# Altium schematic symbol library IC_ADI.SCHLIB: 3169 symbols (part 49 of 181)
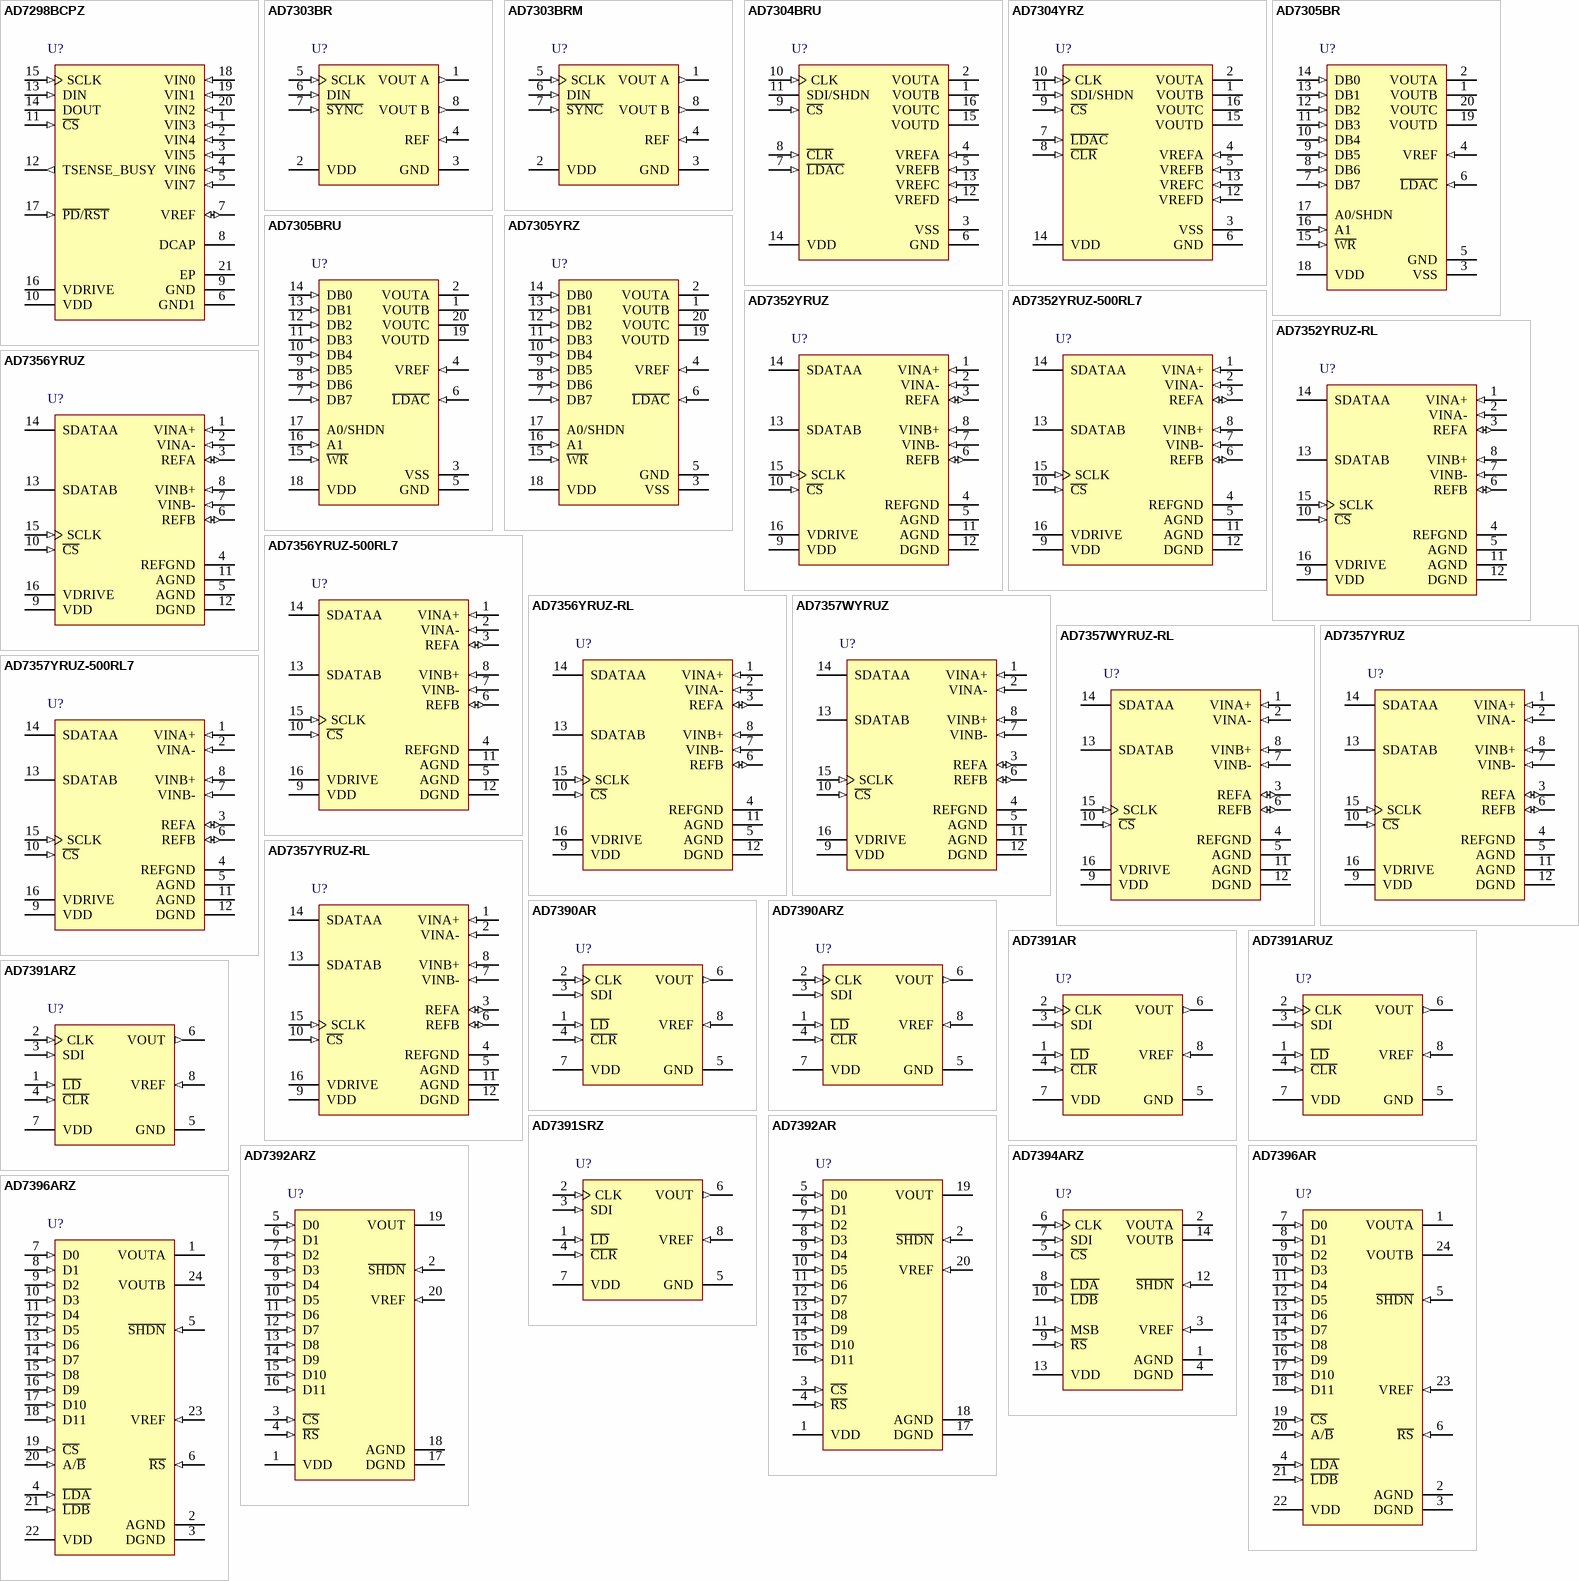
[diagram p239: symbols AD7298BCPZ to AD7396ARZ]

## AD7303BR
designator U?
Dual 8-Bit Voltage Output Digital-to-Analog Converter with Serial Interface, 2.7 to 5.5 V, 0 to +70 degC, R-8, Tube; Generic Part Number: AD7303; PartNumber: AD7303BR; # DAC Outputs: 2; Max V+: 5.5V; Op Pwr Diss: 6.93mW; Resolution (Bits): 8; Settling Time: 1.2祍; Single Supply: Yes; DatasheetVersion: Rev.0; PackageVersion: 060506-A; PackageReference: R-8; PackageDescription: 8-Lead Standard Small Outline Package [SOIC_N] Narrow Body; Supplier Part Number 1: AD7303BR-ND; Supplier Part Number 2: 584-AD7303BR; Packing: Tube; RoHS: N; Mounting Technology: Surface Mount; Code_JEDEC: MS-012-AA; Code_IPC: SOIC127P600-8; ComponentLink1Description: Manufacturer URL; ComponentLink2Description: Datasheet; ComponentLink3Description: Package Specification; ComponentLink4Description: Product URL
footprint SOIC8_1.27 (Footprint not found)
pins: 1 VOUT A (out) "Analog Output Voltage from DAC A. The output amplifier swings rail to rail on its output.", 2 VDD (power) "Power Supply Input. These parts can be operated from +2.7 V to +5.5 V and should be decoupled to GND.", 3 GND (power) "Ground reference point for all circuitry on the part.", 4 REF (in) "External Reference Input. This can be used as the reference for both DACs, and is selected by setting the I\N\T\/EXT bit in the control register to a logic one. The range on this reference input is 1 V to VDD/2. When the (See Datasheet)", 5 SCLK (in) "Serial Clock. Logic Input. Data is clocked into the input shift register on the rising edge of the serial clock input. Data can be transferred at rates up to 30 MHz.", 6 DIN (in) "Serial Data Input. This device has a 16-bit shift register, 8 bits for data and 8 bits for control. Data is clocked into the register on the rising edge of the clock input.", 7 ~{SYNC} (in) "Level Triggered Control Input (active low). This is the frame synchronization signal for the input data. When S\Y\N\C\ goes low, it enables the input shift register and data is transferred in on the rising edges of the (See Datasheet)", 8 VOUT B (out) "Analog output voltage from DAC B. The output amplifier swings rail to rail on its output."

## AD7303BRM
designator U?
Dual 8-Bit Voltage Output Digital-to-Analog Converter with Serial Interface, 2.7 to 5.5 V, -40 to +105 degC, RM-8, Tube; Generic Part Number: AD7303; PartNumber: AD7303BRM; # DAC Outputs: 2; Max V+: 5.5V; Op Pwr Diss: 6.93mW; Resolution (Bits): 8; Settling Time: 1.2祍; Single Supply: Yes; DatasheetVersion: Rev.0; PackageVersion: Aug-2005; PackageReference: RM-8; PackageDescription: 8-Lead Mini Small Outline Package [MSOP]; Supplier Part Number 1: AD7303BRM-ND; Supplier Part Number 2: 584-AD7303BRM; Packing: Tube; RoHS: N; Mounting Technology: Surface Mount; Code_JEDEC: MO-187-AA; ComponentLink1Description: Manufacturer URL; ComponentLink2Description: Datasheet; ComponentLink3Description: Package Specification; ComponentLink4Description: Product URL
footprint VSSOP8_0.65 (Footprint not found)
pins: 1 VOUT A (out) "Analog Output Voltage from DAC A. The output amplifier swings rail to rail on its output.", 2 VDD (power) "Power Supply Input. These parts can be operated from +2.7 V to +5.5 V and should be decoupled to GND.", 3 GND (power) "Ground reference point for all circuitry on the part.", 4 REF (in) "External Reference Input. This can be used as the reference for both DACs, and is selected by setting the I\N\T\/EXT bit in the control register to a logic one. The range on this reference input is 1 V to VDD/2. When the (See Datasheet)", 5 SCLK (in) "Serial Clock. Logic Input. Data is clocked into the input shift register on the rising edge of the serial clock input. Data can be transferred at rates up to 30 MHz.", 6 DIN (in) "Serial Data Input. This device has a 16-bit shift register, 8 bits for data and 8 bits for control. Data is clocked into the register on the rising edge of the clock input.", 7 ~{SYNC} (in) "Level Triggered Control Input (active low). This is the frame synchronization signal for the input data. When S\Y\N\C\ goes low, it enables the input shift register and data is transferred in on the rising edges of the (See Datasheet)", 8 VOUT B (out) "Analog output voltage from DAC B. The output amplifier swings rail to rail on its output."

## AD7304BRU
designator U?
Quad 8-Bit Rail-to-Rail Output Digital-to-Analog Converter, 3 V / 5 V, -40 to +85 degC, RU-16, Tube; Generic Part Number: AD7304; PartNumber: AD7304BRU; # DAC Outputs: 4; Max V+: 5.5V; Op Pwr Diss: 60mW; Resolution (Bits): 8; Settling Time: 1祍; Single Supply: Yes; DatasheetVersion: Rev.C; PackageVersion: Nov-2002; PackageReference: RU-16; PackageDescription: 16-Lead Thin Shrink Small Outline Package [TSSOP]; Supplier Part Number 1: AD7304BRU-ND; Supplier Part Number 2: 584-AD7304BRU; Packing: Tube; RoHS: N; Mounting Technology: Surface Mount; Code_JEDEC: MO-153-AB; ComponentLink1Description: Manufacturer URL; ComponentLink2Description: Datasheet; ComponentLink3Description: Package Specification; ComponentLink4Description: Product URL
footprint TSSOP16_0.65 (Footprint not found)
pins: 1 VOUTB (hiz) "Channel B Rail-to-Rail Buffered DAC Voltage Output. Full-scale set by reference voltage applied to VREFB pin. Output is open circuit when SHDN is enabled.", 2 VOUTA (hiz) "Channel A Rail-to-Rail Buffered DAC Voltage Output. Full-scale set by reference voltage applied to VREFA pin. Output is open circuit when SHDN is enabled.", 3 VSS (power) "Negative Power Supply Input. Specified range of operation is 0 V to -5.5 V.", 4 VREFA (in) "Channel A Reference Input. Establishes VOUTA full-scale voltage. Specified range of operation is VSS < VREFA < VDD.", 5 VREFB (in) "Channel B Reference Input. Establishes VOUTB full-scale voltage. Specified range of operation is VSS < VREFB < VDD.", 6 GND (power) "Common Analog and Digital Ground.", 7 ~{LDAC} (in) "Load DAC Register Strobe, Active Low. Simultaneously transfers data from all four input registers into the corresponding DAC registers. Asynchronous active low input. DAC register is transparent when L\D\A\C\ = 0. See Table (See Datasheet)", 8 ~{CLR} (in) "Clears All Input and DAC Registers to the Zero Condition. Asynchronous active low input. The serial register is not effected.", 9 ~{CS} (in) "Chip Select, Active Low Input. Disables shift register loading when high. Transfers serial input register data to the decoded input register when C\S\ returns high. Does not effect L\D\A\C\ operation.", 10 CLK (in) "Clock Input, Positive Edge Clocks Data into Shift Register. Disabled by chip select C\S\.", 11 SDI/SHDN "Serial Data Input Loads Directly into the Shift Register, MSB First. Hardware shutdown (SHDN) control input, active when pin is left floating by a three-state logic driver. Does not effect DAC register contents as long as (See Datasheet)", 12 VREFD (in) "Channel D Reference Input. Establishes VOUTD full-scale voltage. Specified range of operation is VSS < VREFD < VDD.", 13 VREFC (in) "Channel C Reference Input. Establishes VOUTC full-scale voltage. Specified range of operation is VSS VREFC < VDD.", 14 VDD (power) "Positive Power Supply Input. Specified range of operation is 2.7 V to 5.5 V.", 15 VOUTD (hiz) "Channel D Rail-to-Rail Buffered DAC Voltage Output. Full-scale set by reference voltage applied to VREFD pin. Output is open circuit when SHDN is enabled.", 16 VOUTC (hiz) "Channel C Rail-to-Rail Buffered DAC Voltage Output. Full-scale set by reference voltage applied to VREFC pin. Output is open circuit when SHDN is enabled."

## AD7304YRZ
designator U?
Quad 8-Bit Rail-to-Rail Output Digital-to-Analog Converter, 3 V / 5 V, -40 to +85 degC, RW-16, Pb-Free, Tube; Generic Part Number: AD7304; PartNumber: AD7304YRZ; # DAC Outputs: 4; Max V+: 5.5V; Op Pwr Diss: 60mW; Resolution (Bits): 8; Settling Time: 1祍; Single Supply: Yes; DatasheetVersion: Rev.C; PackageVersion: 032707-B; PackageReference: RW-16; PackageDescription: 16-Lead Standard Small Outline Package [SOIC_W]; Supplier Part Number 1: AD7304YRZ-ND; Supplier Part Number 2: 1438404; Supplier Part Number 3: 15P0787; Supplier Part Number 4: 584-AD7304YRZ; Packing: Tube; RoHS: Y; Mounting Technology: Surface Mount; Code_JEDEC: MS-013-AA; Code_IPC: SOIC127P1030-16; ComponentLink1Description: Manufacturer URL; ComponentLink2Description: Datasheet; ComponentLink3Description: Package Specification; ComponentLink4Description: Product URL
footprint SOIC16W_1.27 (Footprint not found)
pins: 1 VOUTB (hiz) "Channel B Rail-to-Rail Buffered DAC Voltage Output. Full-scale set by reference voltage applied to VREFB pin. Output is open circuit when SHDN is enabled.", 2 VOUTA (hiz) "Channel A Rail-to-Rail Buffered DAC Voltage Output. Full-scale set by reference voltage applied to VREFA pin. Output is open circuit when SHDN is enabled.", 3 VSS (power) "Negative Power Supply Input. Specified range of operation is 0 V to -5.5 V.", 4 VREFA (in) "Channel A Reference Input. Establishes VOUTA full-scale voltage. Specified range of operation is VSS < VREFA < VDD.", 5 VREFB (in) "Channel B Reference Input. Establishes VOUTB full-scale voltage. Specified range of operation is VSS < VREFB < VDD.", 6 GND (power) "Common Analog and Digital Ground.", 7 ~{LDAC} (in) "Load DAC Register Strobe, Active Low. Simultaneously transfers data from all four input registers into the corresponding DAC registers. Asynchronous active low input. DAC register is transparent when L\D\A\C\ = 0. See Table (See Datasheet)", 8 ~{CLR} (in) "Clears All Input and DAC Registers to the Zero Condition. Asynchronous active low input. The serial register is not effected.", 9 ~{CS} (in) "Chip Select, Active Low Input. Disables shift register loading when high. Transfers serial input register data to the decoded input register when C\S\ returns high. Does not effect L\D\A\C\ operation.", 10 CLK (in) "Clock Input, Positive Edge Clocks Data into Shift Register. Disabled by chip select C\S\.", 11 SDI/SHDN (in) "Serial Data Input Loads Directly into the Shift Register, MSB First. Hardware shutdown (SHDN) control input, active when pin is left floating by a three-state logic driver. Does not effect DAC register contents as long as (See Datasheet)", 12 VREFD (in) "Channel D Reference Input. Establishes VOUTD full-scale voltage. Specified range of operation is VSS < VREFD < VDD.", 13 VREFC (in) "Channel C Reference Input. Establishes VOUTC full-scale voltage. Specified range of operation is VSS VREFC < VDD.", 14 VDD (power) "Positive Power Supply Input. Specified range of operation is 2.7 V to 5.5 V.", 15 VOUTD (hiz) "Channel D Rail-to-Rail Buffered DAC Voltage Output. Full-scale set by reference voltage applied to VREFD pin. Output is open circuit when SHDN is enabled.", 16 VOUTC (hiz) "Channel C Rail-to-Rail Buffered DAC Voltage Output. Full-scale set by reference voltage applied to VREFC pin. Output is open circuit when SHDN is enabled."

## AD7305BR
designator U?
Quad 8-Bit Rail-to-Rail Output Digital-to-Analog Converter, 3 V / 5 V, -40 to +85 degC, RW-20, Tube; Generic Part Number: AD7305; PartNumber: AD7305BR; # DAC Outputs: 4; Max V+: 5.5V; Op Pwr Diss: 60mW; Resolution (Bits): 8; Settling Time: 1祍; Single Supply: Yes; DatasheetVersion: Rev.C; PackageVersion: 060706-A; PackageReference: RW-20; PackageDescription: 20-Lead Standard Small Outline Package [SOIC_W] Wide Body; Supplier Part Number 1: AD7305BR-ND; Supplier Part Number 2: 584-AD7305BR; Packing: Tube; RoHS: N; Mounting Technology: Surface Mount; Code_JEDEC: MS-013-AC; ComponentLink1Description: Manufacturer URL; ComponentLink2Description: Datasheet; ComponentLink3Description: Package Specification; ComponentLink4Description: Product URL
footprint SOIC20W_1.27 (Footprint not found)
pins: 1 VOUTB (hiz) "Channel B Rail-to-Rail Buffered DAC Voltage Output. Full-scale set by reference voltage applied to VREFB pin. Output is open circuit when SHDN is enabled.", 2 VOUTA (hiz) "Channel A Rail-to-Rail Buffered DAC Voltage Output. Full-scale set by reference voltage applied to VREFA pin. Output is open circuit when SHDN is enabled.", 3 VSS (power) "Negative Power Supply Input. Specified range of operation is 0 V to -5.5 V.", 4 VREF (in) "Channel B Reference Input. Establishes VOUT full-scale voltage. Specified range of operation is VSS < VREF < VDD.", 5 GND (power) "Common Analog and Digital Ground", 6 ~{LDAC} (in) "Load DAC Register Strobe, Active Low. Simultaneously transfers data from all four input registers into the corresponding DAC registers. Asynchronous active low input. DAC register is transparent when L\D\A\C\ = 0. See Table (See Datasheet)", 7 DB7 (in) "MSB Digital Input Data Bit.", 8 DB6 (in) "Data Bit 6.", 9 DB5 (in) "Data Bit 5.", 10 DB4 (in) "Data Bit 4.", 11 DB3 (in) "Data Bit 3.", 12 DB2 (in) "Data Bit 2.", 13 DB1 (in) "Data Bit 1.", 14 DB0 (in) "LSB Digital Input Data Bit.", 15 ~{WR} (in) "Write Data into Input Register Control Line, Active Low. See Table 6 for operation.", 16 A1 (in) "Address Bit 1.", 17 A0/SHDN "Address Bit 0/Hardware Shutdown (SHDN) Control Input, Active When Pin Is Left Floating by a Three-State Logic Driver. Does not effect DAC register contents as long as power is present on VDD.", 18 VDD (power) "Positive Power Supply Input. Specified range of operation is 2.7 V to 5.5 V.", 19 VOUTD (hiz) "Channel D Rail-to-Rail Buffered DAC Voltage Output. Full-scale set by reference voltage applied to VREFD pin. Output is open circuit when SHDN is enabled", 20 VOUTC (hiz) "Channel C Rail-to-Rail Buffered DAC Voltage Output. Full-scale set by reference voltage applied to VREFC pin. Output is open circuit when SHDN is enabled."

## AD7305BRU
designator U?
Quad 8-Bit Rail-to-Rail Output Digital-to-Analog Converter, 3 V / 5 V, -40 to +85 degC, RU-20, Tube; Generic Part Number: AD7305; PartNumber: AD7305BRU; # DAC Outputs: 4; Max V+: 5.5V; Op Pwr Diss: 60mW; Resolution (Bits): 8; Settling Time: 1祍; Single Supply: Yes; DatasheetVersion: Rev.C; PackageVersion: 2000; PackageReference: RU-20; PackageDescription: 20-Lead Thin Shrink Small Outline Package [TSSOP]; Supplier Part Number 1: AD7305BRU-ND; Supplier Part Number 2: 584-AD7305BRU; Packing: Tube; RoHS: N; Mounting Technology: Surface Mount; Code_JEDEC: MO-153AC; ComponentLink1Description: Manufacturer URL; ComponentLink2Description: Datasheet; ComponentLink3Description: Package Specification; ComponentLink4Description: Product URL
footprint TSSOP20_0.65 (Footprint not found)
pins: 1 VOUTB (hiz) "Channel B Rail-to-Rail Buffered DAC Voltage Output. Full-scale set by reference voltage applied to VREFB pin. Output is open circuit when SHDN is enabled", 2 VOUTA (hiz) "Channel A Rail-to-Rail Buffered DAC Voltage Output. Full-scale set by reference voltage applied to VREFA pin. Output is open circuit when SHDN is enabled.", 3 VSS (power) "Negative Power Supply Input. Specified range of operation is 0 V to -5.5 V.", 4 VREF (in) "Channel B Reference Input. Establishes VOUT full-scale voltage. Specified range of operation is VSS < VREF < VDD.", 5 GND (power) "Common Analog and Digital Ground.", 6 ~{LDAC} (in) "Load DAC Register Strobe, Active Low. Simultaneously transfers data from all four input registers into the corresponding DAC registers. Asynchronous active low input. DAC register is transparent when L\D\A\C\ = 0. See Table (See Datasheet)", 7 DB7 (in) "MSB Digital Input Data Bit", 8 DB6 (in) "Data Bit 6.", 9 DB5 (in) "Data Bit 5.", 10 DB4 (in) "Data Bit 4.", 11 DB3 (in) "Data Bit 3.", 12 DB2 (in) "Data Bit 2.", 13 DB1 (in) "Data Bit 1.", 14 DB0 (in) "LSB Digital Input Data Bit.", 15 ~{WR} (in) "Write Data into Input Register Control Line, Active Low. See Table 6 for operation.", 16 A1 (in) "Address Bit 1.", 17 A0/SHDN "Address Bit 0/Hardware Shutdown (SHDN) Control Input, Active When Pin Is Left Floating by a Three-State Logic Driver. Does not effect DAC register contents as long as power is present on VDD", 18 VDD (power) "Positive Power Supply Input. Specified range of operation is 2.7 V to 5.5 V.", 19 VOUTD (hiz) "Channel D Rail-to-Rail Buffered DAC Voltage Output. Full-scale set by reference voltage applied to VREFD pin. Output is open circuit when SHDN is enabled.", 20 VOUTC (hiz) "Channel C Rail-to-Rail Buffered DAC Voltage Output. Full-scale set by reference voltage applied to VREFC pin. Output is open circuit when SHDN is enabled."

## AD7305YRZ
designator U?
Quad 8-Bit Rail-to-Rail Output Digital-to-Analog Converter, 3 V / 5 V, -40 to +125 degC, RW-20, Pb-Free, Tube; Generic Part Number: AD7305; PartNumber: AD7305YRZ; # DAC Outputs: 4; Max V+: 5.5V; Op Pwr Diss: 60mW; Resolution (Bits): 8; Settling Time: 1祍; Single Supply: Yes; DatasheetVersion: Rev.C; PackageVersion: 060706-A; PackageReference: RW-20; PackageDescription: 20-Lead Standard Small Outline Package [SOIC_W] Wide Body; Supplier Part Number 1: AD7305YRZ-ND; Supplier Part Number 2: 584-AD7305YRZ; Packing: Tube; RoHS: Y; Mounting Technology: Surface Mount; Code_JEDEC: MS-013-AC; ComponentLink1Description: Manufacturer URL; ComponentLink2Description: Datasheet; ComponentLink3Description: Package Specification; ComponentLink4Description: Product URL
footprint SOIC20W_1.27 (Footprint not found)
pins: 1 VOUTB (hiz) "Channel B Rail-to-Rail Buffered DAC Voltage Output. Full-scale set by reference voltage applied to VREFB pin. Output is open circuit when SHDN is enabled.", 2 VOUTA (hiz) "Channel A Rail-to-Rail Buffered DAC Voltage Output. Full-scale set by reference voltage applied to VREFA pin. Output is open circuit when SHDN is enabled.", 3 VSS (power) "Negative Power Supply Input. Specified range of operation is 0 V to -5.5 V.", 4 VREF (in) "Channel B Reference Input. Establishes VOUT full-scale voltage. Specified range of operation is VSS < VREF < VDD.", 5 GND (power) "Common Analog and Digital Ground", 6 ~{LDAC} (in) "Load DAC Register Strobe, Active Low. Simultaneously transfers data from all four input registers into the corresponding DAC registers. Asynchronous active low input. DAC register is transparent when L\D\A\C\ = 0. See Table (See Datasheet)", 7 DB7 (in) "MSB Digital Input Data Bit.", 8 DB6 (in) "Data Bit 6.", 9 DB5 (in) "Data Bit 5.", 10 DB4 (in) "Data Bit 4.", 11 DB3 (in) "Data Bit 3.", 12 DB2 (in) "Data Bit 2.", 13 DB1 (in) "Data Bit 1.", 14 DB0 (in) "LSB Digital Input Data Bit.", 15 ~{WR} (in) "Write Data into Input Register Control Line, Active Low. See Table 6 for operation.", 16 A1 (in) "Address Bit 1.", 17 A0/SHDN "Address Bit 0/Hardware Shutdown (SHDN) Control Input, Active When Pin Is Left Floating by a Three-State Logic Driver. Does not effect DAC register contents as long as power is present on VDD.", 18 VDD (power) "Positive Power Supply Input. Specified range of operation is 2.7 V to 5.5 V.", 19 VOUTD (hiz) "Channel D Rail-to-Rail Buffered DAC Voltage Output. Full-scale set by reference voltage applied to VREFD pin. Output is open circuit when SHDN is enabled", 20 VOUTC (hiz) "Channel C Rail-to-Rail Buffered DAC Voltage Output. Full-scale set by reference voltage applied to VREFC pin. Output is open circuit when SHDN is enabled."

## AD7352YRUZ
designator U?
Dual 12-Bit SAR Analog-to-Digital Converter with Serial, SPI Interface, Simultaneous Sampling, 3MSPS, -40 to +125 degC, RU-16, Pb-Free, Tube; Generic Part Number: AD7352; PartNumber: AD7352YRUZ; Resolution (Bits): 12; Channels: 2; Throughput Rate (SPS): 3M; Interface: Ser, SPI; DatasheetVersion: Rev.A; PackageVersion: Nov-2002; PackageReference: RU-16; PackageDescription: 16-Lead Thin Shrink Small Outline Package [TSSOP]; Supplier Part Number 1: AD7352YRUZ-ND; Supplier Part Number 2: 584-AD7352YRUZ; RoHS: Y; Packing: Tube; Mounting Technology: Surface Mount; Code_JEDEC: MO-153-AB; ComponentLink1Description: Manufacturer URL; ComponentLink2Description: Datasheet; ComponentLink3Description: Package Specification; ComponentLink4Description: Product URL
footprint TSSOP16_0.65 (Footprint not found)
pins: 1 VINA+ (in) "Analog Inputs of ADC A. These analog inputs form a fully differential pair.", 2 VINA- (in) "Analog Inputs of ADC A. These analog inputs form a fully differential pair.", 3 REFA (io) "Reference Decoupling Capacitor Pins. Decoupling capacitors are connected between these pins and the REFGND pin to decouple the reference buffer for each respective ADC. It is recommended to decouple each reference pin with a (See Datasheet)", 4 REFGND (power) "Reference Ground. This is the ground reference point for the reference circuitry on the AD7352. Any external reference signal should be referred to this REFGND voltage. Decoupling capacitors must be placed between this pin (See Datasheet)", 5 AGND (power) "Analog Ground. This is the ground reference point for all analog circuitry on the AD7352. Refer all analog input signals to this AGND voltage. The AGND and DGND voltages should ideally be at the same potential and must not (See Datasheet)", 6 REFB (io) "Reference Decoupling Capacitor Pins. Decoupling capacitors are connected between these pins and the REFGND pin to decouple the reference buffer for each respective ADC. It is recommended to decouple each reference pin with a (See Datasheet)", 7 VINB- (in) "Analog Inputs of ADC B. These analog inputs form a fully differential pair.", 8 VINB+ (in) "Analog Inputs of ADC B. These analog inputs form a fully differential pair.", 9 VDD (power) "Power Supply Input. The VDD range for the AD7352 is 2.5 V +/-10%. Decouple the supply to AGND with a 0.1 uF capacitor in parallel with a 10 uF tantalum capacitor.", 10 ~{CS} (in) "Chip Select. Active low, logic input. This input provides the dual functions of initiating conversions on the AD7352 and framing the serial data transfer.", 11 AGND (power) "Analog Ground. This is the ground reference point for all analog circuitry on the AD7352. Refer all analog input signals to this AGND voltage. The AGND and DGND voltages should ideally be at the same potential and must not (See Datasheet)", 12 DGND (power) "Digital Ground. This is the ground reference point for all digital circuitry on the AD7352. Connect this pin to the DGND plane of a system. The DGND and AGND voltages should ideally be at the same potential and must not be (See Datasheet)", 13 SDATAB (hiz) "Serial Data Outputs. The data output is supplied to each pin as a serial data stream. The bits are clocked out on the falling edge of the SCLK input. To access the 12 bits of data from the AD7352, 14 SCLK falling edges are (See Datasheet)", 14 SDATAA (hiz) "Serial Data Outputs. The data output is supplied to each pin as a serial data stream. The bits are clocked out on the falling edge of the SCLK input. To access the 12 bits of data from the AD7352, 14 SCLK falling edges are (See Datasheet)", 15 SCLK (in) "Serial Clock, Logic Input. A serial clock input provides the serial clock for accessing the data from the AD7352. This clock is also used as the clock source for the conversion process.", 16 VDRIVE (power) "Logic Power Supply Input. The voltage supplied at this pin determines at what voltage the interface operates. The voltage at this pin may be different than the voltage at VDD. The VDRIVE supply should be decoupled to DGND (See Datasheet)"

## AD7352YRUZ-500RL7
designator U?
Dual 12-Bit SAR Analog-to-Digital Converter with Serial, SPI Interface, Simultaneous Sampling, 3MSPS, -40 to +125 degC, RU-16, Pb-Free, Reel; Generic Part Number: AD7352; PartNumber: AD7352YRUZ-500RL7; Resolution (Bits): 12; Channels: 2; Throughput Rate (SPS): 3M; Interface: Ser, SPI; DatasheetVersion: Rev.A; PackageVersion: Nov-2002; PackageReference: RU-16; PackageDescription: 16-Lead Thin Shrink Small Outline Package [TSSOP]; Supplier Part Number 1: AD7352YRUZ-500RL7-ND; Supplier Part Number 2: 584-AD7352YRUZ-500R7; RoHS: Y; Packing: Reel; Mounting Technology: Surface Mount; Code_JEDEC: MO-153-AB; ComponentLink1Description: Manufacturer URL; ComponentLink2Description: Datasheet; ComponentLink3Description: Package Specification; ComponentLink4Description: Product URL
footprint TSSOP16_0.65 (Footprint not found)
pins: 1 VINA+ (in) "Analog Inputs of ADC A. These analog inputs form a fully differential pair.", 2 VINA- (in) "Analog Inputs of ADC A. These analog inputs form a fully differential pair.", 3 REFA (io) "Reference Decoupling Capacitor Pins. Decoupling capacitors are connected between these pins and the REFGND pin to decouple the reference buffer for each respective ADC. It is recommended to decouple each reference pin with a (See Datasheet)", 4 REFGND (power) "Reference Ground. This is the ground reference point for the reference circuitry on the AD7352. Any external reference signal should be referred to this REFGND voltage. Decoupling capacitors must be placed between this pin (See Datasheet)", 5 AGND (power) "Analog Ground. This is the ground reference point for all analog circuitry on the AD7352. Refer all analog input signals to this AGND voltage. The AGND and DGND voltages should ideally be at the same potential and must not (See Datasheet)", 6 REFB (io) "Reference Decoupling Capacitor Pins. Decoupling capacitors are connected between these pins and the REFGND pin to decouple the reference buffer for each respective ADC. It is recommended to decouple each reference pin with a (See Datasheet)", 7 VINB- (in) "Analog Inputs of ADC B. These analog inputs form a fully differential pair.", 8 VINB+ (in) "Analog Inputs of ADC B. These analog inputs form a fully differential pair.", 9 VDD (power) "Power Supply Input. The VDD range for the AD7352 is 2.5 V +/-10%. Decouple the supply to AGND with a 0.1 uF capacitor in parallel with a 10 uF tantalum capacitor.", 10 ~{CS} (in) "Chip Select. Active low, logic input. This input provides the dual functions of initiating conversions on the AD7352 and framing the serial data transfer.", 11 AGND (power) "Analog Ground. This is the ground reference point for all analog circuitry on the AD7352. Refer all analog input signals to this AGND voltage. The AGND and DGND voltages should ideally be at the same potential and must not (See Datasheet)", 12 DGND (power) "Digital Ground. This is the ground reference point for all digital circuitry on the AD7352. Connect this pin to the DGND plane of a system. The DGND and AGND voltages should ideally be at the same potential and must not be (See Datasheet)", 13 SDATAB (hiz) "Serial Data Outputs. The data output is supplied to each pin as a serial data stream. The bits are clocked out on the falling edge of the SCLK input. To access the 12 bits of data from the AD7352, 14 SCLK falling edges are (See Datasheet)", 14 SDATAA (hiz) "Serial Data Outputs. The data output is supplied to each pin as a serial data stream. The bits are clocked out on the falling edge of the SCLK input. To access the 12 bits of data from the AD7352, 14 SCLK falling edges are (See Datasheet)", 15 SCLK (in) "Serial Clock, Logic Input. A serial clock input provides the serial clock for accessing the data from the AD7352. This clock is also used as the clock source for the conversion process.", 16 VDRIVE (power) "Logic Power Supply Input. The voltage supplied at this pin determines at what voltage the interface operates. The voltage at this pin may be different than the voltage at VDD. The VDRIVE supply should be decoupled to DGND (See Datasheet)"

## AD7352YRUZ-RL
designator U?
Dual 12-Bit SAR Analog-to-Digital Converter with Serial, SPI Interface, Simultaneous Sampling, 3MSPS, -40 to +125 degC, RU-16, Pb-Free, Reel; Generic Part Number: AD7352; PartNumber: AD7352YRUZ-RL; Resolution (Bits): 12; Channels: 2; Throughput Rate (SPS): 3M; Interface: Ser, SPI; DatasheetVersion: Rev.A; PackageVersion: Nov-2002; PackageReference: RU-16; PackageDescription: 16-Lead Thin Shrink Small Outline Package [TSSOP]; Supplier Part Number 1: AD7352YRUZ-RL-ND; Supplier Part Number 2: 584-AD7352YRUZ-R; RoHS: Y; Packing: Reel; Mounting Technology: Surface Mount; Code_JEDEC: MO-153-AB; ComponentLink1Description: Manufacturer URL; ComponentLink2Description: Datasheet; ComponentLink3Description: Package Specification; ComponentLink4Description: Product URL
footprint TSSOP16_0.65 (Footprint not found)
pins: 1 VINA+ (in) "Analog Inputs of ADC A. These analog inputs form a fully differential pair.", 2 VINA- (in) "Analog Inputs of ADC A. These analog inputs form a fully differential pair.", 3 REFA (io) "Reference Decoupling Capacitor Pins. Decoupling capacitors are connected between these pins and the REFGND pin to decouple the reference buffer for each respective ADC. It is recommended to decouple each reference pin with a (See Datasheet)", 4 REFGND (power) "Reference Ground. This is the ground reference point for the reference circuitry on the AD7352. Any external reference signal should be referred to this REFGND voltage. Decoupling capacitors must be placed between this pin (See Datasheet)", 5 AGND (power) "Analog Ground. This is the ground reference point for all analog circuitry on the AD7352. Refer all analog input signals to this AGND voltage. The AGND and DGND voltages should ideally be at the same potential and must not (See Datasheet)", 6 REFB (io) "Reference Decoupling Capacitor Pins. Decoupling capacitors are connected between these pins and the REFGND pin to decouple the reference buffer for each respective ADC. It is recommended to decouple each reference pin with a (See Datasheet)", 7 VINB- (in) "Analog Inputs of ADC B. These analog inputs form a fully differential pair.", 8 VINB+ (in) "Analog Inputs of ADC B. These analog inputs form a fully differential pair.", 9 VDD (power) "Power Supply Input. The VDD range for the AD7352 is 2.5 V +/-10%. Decouple the supply to AGND with a 0.1 uF capacitor in parallel with a 10 uF tantalum capacitor.", 10 ~{CS} (in) "Chip Select. Active low, logic input. This input provides the dual functions of initiating conversions on the AD7352 and framing the serial data transfer.", 11 AGND (power) "Analog Ground. This is the ground reference point for all analog circuitry on the AD7352. Refer all analog input signals to this AGND voltage. The AGND and DGND voltages should ideally be at the same potential and must not (See Datasheet)", 12 DGND (power) "Digital Ground. This is the ground reference point for all digital circuitry on the AD7352. Connect this pin to the DGND plane of a system. The DGND and AGND voltages should ideally be at the same potential and must not be (See Datasheet)", 13 SDATAB (hiz) "Serial Data Outputs. The data output is supplied to each pin as a serial data stream. The bits are clocked out on the falling edge of the SCLK input. To access the 12 bits of data from the AD7352, 14 SCLK falling edges are (See Datasheet)", 14 SDATAA (hiz) "Serial Data Outputs. The data output is supplied to each pin as a serial data stream. The bits are clocked out on the falling edge of the SCLK input. To access the 12 bits of data from the AD7352, 14 SCLK falling edges are (See Datasheet)", 15 SCLK (in) "Serial Clock, Logic Input. A serial clock input provides the serial clock for accessing the data from the AD7352. This clock is also used as the clock source for the conversion process.", 16 VDRIVE (power) "Logic Power Supply Input. The voltage supplied at this pin determines at what voltage the interface operates. The voltage at this pin may be different than the voltage at VDD. The VDRIVE supply should be decoupled to DGND (See Datasheet)"

## AD7356YRUZ
designator U?
Dual 12-Bit SAR Analog-to-Digital Converter with Serial, SPI Interface, Simultaneous Sampling, 5MSPS, -40 to +125 degC, RU-16, Pb-Free, Tube; Generic Part Number: AD7356; PartNumber: AD7356YRUZ; Resolution (Bits): 12; Channels: 2; Throughput Rate (SPS): 5M; Interface: Ser, SPI; DatasheetVersion: Rev.A; PackageVersion: Nov-2002; PackageReference: RU-16; PackageDescription: 16-Lead Thin Shrink Small Outline Package [TSSOP]; Supplier Part Number 1: AD7356YRUZ-ND; Supplier Part Number 2: 34P3193; Supplier Part Number 3: 584-AD7356YRUZ; RoHS: Y; Packing: Tube; Mounting Technology: Surface Mount; Code_JEDEC: MO-153-AB; ComponentLink1Description: Manufacturer URL; ComponentLink2Description: Datasheet; ComponentLink3Description: Package Specification; ComponentLink4Description: Product URL
footprint TSSOP16_0.65 (Footprint not found)
pins: 1 VINA+ (in) "Analog Inputs of ADC A. These analog inputs form a fully differential pair.", 2 VINA- (in) "Analog Inputs of ADC A. These analog inputs form a fully differential pair.", 3 REFA (io) "Reference Decoupling Capacitor Pins. Decoupling capacitors are connected between these pins and the REFGND pin to decouple the reference buffer for each respective ADC. It is recommended to decouple each reference pin with a (See Datasheet)", 4 REFGND (power) "Reference Ground. This is the ground reference point for the reference circuitry on the AD7356. Refer any external reference signal to this REFGND voltage. Decoupling capacitors must be placed between this pin and the REFA (See Datasheet)", 5 AGND (power) "Analog Ground. This is the ground reference point for all analog circuitry on the AD7356. All analog input signals should be referred to this AGND voltage. The AGND and DGND voltages should ideally be at the same potential (See Datasheet)", 6 REFB (io) "Reference Decoupling Capacitor Pins. Decoupling capacitors are connected between these pins and the REFGND pin to decouple the reference buffer for each respective ADC. It is recommended to decouple each reference pin with a (See Datasheet)", 7 VINB- (in) "Analog Inputs of ADC B. These analog inputs form a fully differential pair.", 8 VINB+ (in) "Analog Inputs of ADC B. These analog inputs form a fully differential pair.", 9 VDD (power) "Power Supply Input. The VDD range for the AD7356 is 2.5 V +/- 10%. Decouple the supply to AGND with a 0.1uF capacitor in parallel with a 10uF tantalum capacitor.", 10 ~{CS} (in) "Chip Select. Active low logic input. This input provides the dual functions of initiating conversions on the AD7356 and framing the serial data transfer.", 11 AGND (power) "Analog Ground. This is the ground reference point for all analog circuitry on the AD7356. All analog input signals should be referred to this AGND voltage. The AGND and DGND voltages should ideally be at the same potential (See Datasheet)", 12 DGND (power) "Digital Ground. This is the ground reference point for all digital circuitry on the AD7356. Connect this pin to the DGND plane of a system. The DGND and AGND voltages should ideally be at the same potential and must not be (See Datasheet)", 13 SDATAB (hiz) "Serial Data Outputs. The data output is supplied to each pin as a serial data stream. The bits are clocked out on the falling edge of the SCLK input. To access the 12 bits of data from the AD7356, 14 SCLK falling edges are (See Datasheet)", 14 SDATAA (hiz) "Serial Data Outputs. The data output is supplied to each pin as a serial data stream. The bits are clocked out on the falling edge of the SCLK input. To access the 12 bits of data from the AD7356, 14 SCLK falling edges are (See Datasheet)", 15 SCLK (in) "Serial Clock. Logic input. A serial clock input provides the serial clock for accessing the data from the AD7356. This clock is also used as the clock source for the conversion process.", 16 VDRIVE (power) "Logic Power Supply Input. The voltage supplied at this pin determines at what voltage the interface operates. The voltage at this pin may be different than the voltage at VDD. The VDRIVE supply should be decoupled to DGND (See Datasheet)"

## AD7356YRUZ-500RL7
designator U?
Dual 12-Bit SAR Analog-to-Digital Converter with Serial, SPI Interface, Simultaneous Sampling, 5MSPS, -40 to +125 degC, RU-16, Pb-Free, Reel; Generic Part Number: AD7356; PartNumber: AD7356YRUZ-500RL7; Resolution (Bits): 12; Channels: 2; Throughput Rate (SPS): 5M; Interface: Ser, SPI; DatasheetVersion: Rev.A; PackageVersion: Nov-2002; PackageReference: RU-16; PackageDescription: 16-Lead Thin Shrink Small Outline Package [TSSOP]; Supplier Part Number 1: AD7356YRUZ-500RL7-ND; Supplier Part Number 2: 584-AD7356YRUZ-500R7; RoHS: Y; Packing: Reel; Mounting Technology: Surface Mount; Code_JEDEC: MO-153-AB; ComponentLink1Description: Manufacturer URL; ComponentLink2Description: Datasheet; ComponentLink3Description: Package Specification; ComponentLink4Description: Product URL
footprint TSSOP16_0.65 (Footprint not found)
pins: 1 VINA+ (in) "Analog Inputs of ADC A. These analog inputs form a fully differential pair.", 2 VINA- (in) "Analog Inputs of ADC A. These analog inputs form a fully differential pair.", 3 REFA (io) "Reference Decoupling Capacitor Pins. Decoupling capacitors are connected between these pins and the REFGND pin to decouple the reference buffer for each respective ADC. It is recommended to decouple each reference pin with a (See Datasheet)", 4 REFGND (power) "Reference Ground. This is the ground reference point for the reference circuitry on the AD7356. Refer any external reference signal to this REFGND voltage. Decoupling capacitors must be placed between this pin and the REFA (See Datasheet)", 5 AGND (power) "Analog Ground. This is the ground reference point for all analog circuitry on the AD7356. All analog input signals should be referred to this AGND voltage. The AGND and DGND voltages should ideally be at the same potential (See Datasheet)", 6 REFB (io) "Reference Decoupling Capacitor Pins. Decoupling capacitors are connected between these pins and the REFGND pin to decouple the reference buffer for each respective ADC. It is recommended to decouple each reference pin with a (See Datasheet)", 7 VINB- (in) "Analog Inputs of ADC B. These analog inputs form a fully differential pair.", 8 VINB+ (in) "Analog Inputs of ADC B. These analog inputs form a fully differential pair.", 9 VDD (power) "Power Supply Input. The VDD range for the AD7356 is 2.5 V +/- 10%. Decouple the supply to AGND with a 0.1uF capacitor in parallel with a 10uF tantalum capacitor.", 10 ~{CS} (in) "Chip Select. Active low logic input. This input provides the dual functions of initiating conversions on the AD7356 and framing the serial data transfer.", 11 AGND (power) "Analog Ground. This is the ground reference point for all analog circuitry on the AD7356. All analog input signals should be referred to this AGND voltage. The AGND and DGND voltages should ideally be at the same potential (See Datasheet)", 12 DGND (power) "Digital Ground. This is the ground reference point for all digital circuitry on the AD7356. Connect this pin to the DGND plane of a system. The DGND and AGND voltages should ideally be at the same potential and must not be (See Datasheet)", 13 SDATAB (hiz) "Serial Data Outputs. The data output is supplied to each pin as a serial data stream. The bits are clocked out on the falling edge of the SCLK input. To access the 12 bits of data from the AD7356, 14 SCLK falling edges are (See Datasheet)", 14 SDATAA (hiz) "Serial Data Outputs. The data output is supplied to each pin as a serial data stream. The bits are clocked out on the falling edge of the SCLK input. To access the 12 bits of data from the AD7356, 14 SCLK falling edges are (See Datasheet)", 15 SCLK (in) "Serial Clock. Logic input. A serial clock input provides the serial clock for accessing the data from the AD7356. This clock is also used as the clock source for the conversion process.", 16 VDRIVE (power) "Logic Power Supply Input. The voltage supplied at this pin determines at what voltage the interface operates. The voltage at this pin may be different than the voltage at VDD. The VDRIVE supply should be decoupled to DGND (See Datasheet)"

## AD7356YRUZ-RL
designator U?
Dual 12-Bit SAR Analog-to-Digital Converter with Serial, SPI Interface, Simultaneous Sampling, 5MSPS, -40 to +125 degC, RU-16, Pb-Free, Reel; Generic Part Number: AD7356; PartNumber: AD7356YRUZ-RL; Resolution (Bits): 12; Channels: 2; Throughput Rate (SPS): 5M; Interface: Ser, SPI; DatasheetVersion: Rev.A; PackageVersion: Nov-2002; PackageReference: RU-16; PackageDescription: 16-Lead Thin Shrink Small Outline Package [TSSOP]; Supplier Part Number 1: AD7356YRUZ-RL-ND; Supplier Part Number 2: 584-AD7356YRUZ-R; RoHS: Y; Packing: Reel; Mounting Technology: Surface Mount; Code_JEDEC: MO-153-AB; ComponentLink1Description: Manufacturer URL; ComponentLink2Description: Datasheet; ComponentLink3Description: Package Specification; ComponentLink4Description: Product URL
footprint TSSOP16_0.65 (Footprint not found)
pins: 1 VINA+ (in) "Analog Inputs of ADC A. These analog inputs form a fully differential pair.", 2 VINA- (in) "Analog Inputs of ADC A. These analog inputs form a fully differential pair.", 3 REFA (io) "Reference Decoupling Capacitor Pins. Decoupling capacitors are connected between these pins and the REFGND pin to decouple the reference buffer for each respective ADC. It is recommended to decouple each reference pin with a (See Datasheet)", 4 REFGND (power) "Reference Ground. This is the ground reference point for the reference circuitry on the AD7356. Refer any external reference signal to this REFGND voltage. Decoupling capacitors must be placed between this pin and the REFA (See Datasheet)", 5 AGND (power) "Analog Ground. This is the ground reference point for all analog circuitry on the AD7356. All analog input signals should be referred to this AGND voltage. The AGND and DGND voltages should ideally be at the same potential (See Datasheet)", 6 REFB (io) "Reference Decoupling Capacitor Pins. Decoupling capacitors are connected between these pins and the REFGND pin to decouple the reference buffer for each respective ADC. It is recommended to decouple each reference pin with a (See Datasheet)", 7 VINB- (in) "Analog Inputs of ADC B. These analog inputs form a fully differential pair.", 8 VINB+ (in) "Analog Inputs of ADC B. These analog inputs form a fully differential pair.", 9 VDD (power) "Power Supply Input. The VDD range for the AD7356 is 2.5 V +/- 10%. Decouple the supply to AGND with a 0.1uF capacitor in parallel with a 10uF tantalum capacitor.", 10 ~{CS} (in) "Chip Select. Active low logic input. This input provides the dual functions of initiating conversions on the AD7356 and framing the serial data transfer.", 11 AGND (power) "Analog Ground. This is the ground reference point for all analog circuitry on the AD7356. All analog input signals should be referred to this AGND voltage. The AGND and DGND voltages should ideally be at the same potential (See Datasheet)", 12 DGND (power) "Digital Ground. This is the ground reference point for all digital circuitry on the AD7356. Connect this pin to the DGND plane of a system. The DGND and AGND voltages should ideally be at the same potential and must not be (See Datasheet)", 13 SDATAB (hiz) "Serial Data Outputs. The data output is supplied to each pin as a serial data stream. The bits are clocked out on the falling edge of the SCLK input. To access the 12 bits of data from the AD7356, 14 SCLK falling edges are (See Datasheet)", 14 SDATAA (hiz) "Serial Data Outputs. The data output is supplied to each pin as a serial data stream. The bits are clocked out on the falling edge of the SCLK input. To access the 12 bits of data from the AD7356, 14 SCLK falling edges are (See Datasheet)", 15 SCLK (in) "Serial Clock. Logic input. A serial clock input provides the serial clock for accessing the data from the AD7356. This clock is also used as the clock source for the conversion process.", 16 VDRIVE (power) "Logic Power Supply Input. The voltage supplied at this pin determines at what voltage the interface operates. The voltage at this pin may be different than the voltage at VDD. The VDRIVE supply should be decoupled to DGND (See Datasheet)"

## AD7357WYRUZ
designator U?
Dual 14-Bit SAR Analog-to-Digital Converter with Serial, SPI Interface, Simultaneous Sampling, 4.25MSPS, -40 to +125 degC, RU-16, Pb-Free, Tube; Generic Part Number: AD7357; PartNumber: AD7357WYRUZ; Resolution (Bits): 14; Channels: 2; Throughput Rate (SPS): 4.25M; Interface: Ser, SPI; Automotive Qualified: Yes; DatasheetVersion: Rev.B; PackageVersion: Nov-2002; PackageReference: RU-16; PackageDescription: 16-Lead Thin Shrink Small Outline Package [TSSOP]; Supplier Part Number 1: AD7357WYRUZ-ND; Supplier Part Number 2: 52W9431; Supplier Part Number 3: 584-AD7357WYRUZ; RoHS: Y; Packing: Tube; Mounting Technology: Surface Mount; Code_JEDEC: MO-153-AB; ComponentLink1Description: Manufacturer URL; ComponentLink2Description: Datasheet; ComponentLink3Description: Package Specification; ComponentLink4Description: Product URL
footprint TSSOP16_0.65 (Footprint not found)
pins: 1 VINA+ (in) "Analog Inputs of ADC A. These analog inputs form a fully differential pair.", 2 VINA- (in) "Analog Inputs of ADC A. These analog inputs form a fully differential pair.", 3 REFA (io) "Reference Decoupling Capacitor Pins. Decoupling capacitors are connected between these pins and the REFGND pin to decouple the reference buffer for each respective ADC. It is recommended to decouple each reference pin with a (See Datasheet)", 4 REFGND (power) "Reference Ground. This is the ground reference point for the reference circuitry on the AD7357. Any external reference signal should be referred to this REFGND voltage. Decoupling capacitors must be placed between this pin (See Datasheet)", 5 AGND (power) "Analog Ground. This is the ground reference point for all analog circuitry on the AD7357. All analog input signals should be referred to this AGND voltage. The AGND and DGND voltages should ideally be at the same potential (See Datasheet)", 6 REFB (io) "Reference Decoupling Capacitor Pins. Decoupling capacitors are connected between these pins and the REFGND pin to decouple the reference buffer for each respective ADC. It is recommended to decouple each reference pin with a (See Datasheet)", 7 VINB- (in) "Analog Inputs of ADC B. These analog inputs form a fully differential pair.", 8 VINB+ (in) "Analog Inputs of ADC B. These analog inputs form a fully differential pair.", 9 VDD (power) "Power Supply Input. The VDD range for the AD7357 is 2.5 V +/- 10%. The supply should be decoupled to AGND with a 0.1uF capacitor and a 10uF tantalum capacitor.", 10 ~{CS} (in) "Chip Select. Active low, logic input. This input provides the dual function of initiating conversions on the AD7357 and framing the serial data transfer.", 11 AGND (power) "Analog Ground. This is the ground reference point for all analog circuitry on the AD7357. All analog input signals should be referred to this AGND voltage. The AGND and DGND voltages should ideally be at the same potential (See Datasheet)", 12 DGND (power) "Digital Ground. This is the ground reference point for all digital circuitry on the AD7357. This pin should connect to the DGND plane of a system. The DGND and AGND voltages should ideally be at the same potential and must (See Datasheet)", 13 SDATAB (hiz) "Serial Data Outputs. The data output is supplied to each pin as a serial data stream. The bits are clocked out on the falling edge of the SCLK input. 16 SCLK falling edges are required to access the 14 bits of data from the (See Datasheet)", 14 SDATAA (hiz) "Serial Data Outputs. The data output is supplied to each pin as a serial data stream. The bits are clocked out on the falling edge of the SCLK input. 16 SCLK falling edges are required to access the 14 bits of data from the (See Datasheet)", 15 SCLK (in) "Serial Clock. Logic input. A serial clock input provides the SCLK for accessing the data from the AD7357. This clock is also used as the clock source for the conversion process.", 16 VDRIVE (power) "Logic Power Supply Input. The voltage supplied at this pin determines at what voltage the interface operates. This pin should be decoupled to DGND. The voltage at this pin may be different to that at VDD."

## AD7357WYRUZ-RL
designator U?
Dual 14-Bit SAR Analog-to-Digital Converter with Serial, SPI Interface, Simultaneous Sampling, 4.25MSPS, -40 to +125 degC, RU-16, Pb-Free, Reel; Generic Part Number: AD7357; PartNumber: AD7357WYRUZ-RL; Resolution (Bits): 14; Channels: 2; Throughput Rate (SPS): 4.25M; Interface: Ser, SPI; Automotive Qualified: Yes; DatasheetVersion: Rev.B; PackageVersion: Nov-2002; PackageReference: RU-16; PackageDescription: 16-Lead Thin Shrink Small Outline Package [TSSOP]; Supplier Part Number 1: AD7357WYRUZ-RL-ND; Supplier Part Number 2: 52W9432; Supplier Part Number 3: 584-AD7357WYRUZ-R; RoHS: Y; Packing: Reel; Mounting Technology: Surface Mount; Code_JEDEC: MO-153-AB; ComponentLink1Description: Manufacturer URL; ComponentLink2Description: Datasheet; ComponentLink3Description: Package Specification; ComponentLink4Description: Product URL
footprint TSSOP16_0.65 (Footprint not found)
pins: 1 VINA+ (in) "Analog Inputs of ADC A. These analog inputs form a fully differential pair.", 2 VINA- (in) "Analog Inputs of ADC A. These analog inputs form a fully differential pair.", 3 REFA (io) "Reference Decoupling Capacitor Pins. Decoupling capacitors are connected between these pins and the REFGND pin to decouple the reference buffer for each respective ADC. It is recommended to decouple each reference pin with a (See Datasheet)", 4 REFGND (power) "Reference Ground. This is the ground reference point for the reference circuitry on the AD7357. Any external reference signal should be referred to this REFGND voltage. Decoupling capacitors must be placed between this pin (See Datasheet)", 5 AGND (power) "Analog Ground. This is the ground reference point for all analog circuitry on the AD7357. All analog input signals should be referred to this AGND voltage. The AGND and DGND voltages should ideally be at the same potential (See Datasheet)", 6 REFB (io) "Reference Decoupling Capacitor Pins. Decoupling capacitors are connected between these pins and the REFGND pin to decouple the reference buffer for each respective ADC. It is recommended to decouple each reference pin with a (See Datasheet)", 7 VINB- (in) "Analog Inputs of ADC B. These analog inputs form a fully differential pair.", 8 VINB+ (in) "Analog Inputs of ADC B. These analog inputs form a fully differential pair.", 9 VDD (power) "Power Supply Input. The VDD range for the AD7357 is 2.5 V +/- 10%. The supply should be decoupled to AGND with a 0.1uF capacitor and a 10uF tantalum capacitor.", 10 ~{CS} (in) "Chip Select. Active low, logic input. This input provides the dual function of initiating conversions on the AD7357 and framing the serial data transfer.", 11 AGND (power) "Analog Ground. This is the ground reference point for all analog circuitry on the AD7357. All analog input signals should be referred to this AGND voltage. The AGND and DGND voltages should ideally be at the same potential (See Datasheet)", 12 DGND (power) "Digital Ground. This is the ground reference point for all digital circuitry on the AD7357. This pin should connect to the DGND plane of a system. The DGND and AGND voltages should ideally be at the same potential and must (See Datasheet)", 13 SDATAB (hiz) "Serial Data Outputs. The data output is supplied to each pin as a serial data stream. The bits are clocked out on the falling edge of the SCLK input. 16 SCLK falling edges are required to access the 14 bits of data from the (See Datasheet)", 14 SDATAA (hiz) "Serial Data Outputs. The data output is supplied to each pin as a serial data stream. The bits are clocked out on the falling edge of the SCLK input. 16 SCLK falling edges are required to access the 14 bits of data from the (See Datasheet)", 15 SCLK (in) "Serial Clock. Logic input. A serial clock input provides the SCLK for accessing the data from the AD7357. This clock is also used as the clock source for the conversion process.", 16 VDRIVE (power) "Logic Power Supply Input. The voltage supplied at this pin determines at what voltage the interface operates. This pin should be decoupled to DGND. The voltage at this pin may be different to that at VDD."

## AD7357YRUZ
designator U?
Dual 14-Bit SAR Analog-to-Digital Converter with Serial, SPI Interface, Simultaneous Sampling, 4.25MSPS, -40 to +125 degC, RU-16, Pb-Free, Tube; Generic Part Number: AD7357; PartNumber: AD7357YRUZ; Resolution (Bits): 14; Channels: 2; Throughput Rate (SPS): 4.25M; Interface: Ser, SPI; Automotive Qualified: Yes; DatasheetVersion: Rev.B; PackageVersion: Nov-2002; PackageReference: RU-16; PackageDescription: 16-Lead Thin Shrink Small Outline Package [TSSOP]; Supplier Part Number 1: AD7357YRUZ-ND; Supplier Part Number 2: 11R1011; Supplier Part Number 3: 584-AD7357YRUZ; RoHS: Y; Packing: Tube; Mounting Technology: Surface Mount; Code_JEDEC: MO-153-AB; ComponentLink1Description: Manufacturer URL; ComponentLink2Description: Datasheet; ComponentLink3Description: Package Specification; ComponentLink4Description: Product URL
footprint TSSOP16_0.65 (Footprint not found)
pins: 1 VINA+ (in) "Analog Inputs of ADC A. These analog inputs form a fully differential pair.", 2 VINA- (in) "Analog Inputs of ADC A. These analog inputs form a fully differential pair.", 3 REFA (io) "Reference Decoupling Capacitor Pins. Decoupling capacitors are connected between these pins and the REFGND pin to decouple the reference buffer for each respective ADC. It is recommended to decouple each reference pin with a (See Datasheet)", 4 REFGND (power) "Reference Ground. This is the ground reference point for the reference circuitry on the AD7357. Any external reference signal should be referred to this REFGND voltage. Decoupling capacitors must be placed between this pin (See Datasheet)", 5 AGND (power) "Analog Ground. This is the ground reference point for all analog circuitry on the AD7357. All analog input signals should be referred to this AGND voltage. The AGND and DGND voltages should ideally be at the same potential (See Datasheet)", 6 REFB (io) "Reference Decoupling Capacitor Pins. Decoupling capacitors are connected between these pins and the REFGND pin to decouple the reference buffer for each respective ADC. It is recommended to decouple each reference pin with a (See Datasheet)", 7 VINB- (in) "Analog Inputs of ADC B. These analog inputs form a fully differential pair.", 8 VINB+ (in) "Analog Inputs of ADC B. These analog inputs form a fully differential pair.", 9 VDD (power) "Power Supply Input. The VDD range for the AD7357 is 2.5 V +/- 10%. The supply should be decoupled to AGND with a 0.1uF capacitor and a 10uF tantalum capacitor.", 10 ~{CS} (in) "Chip Select. Active low, logic input. This input provides the dual function of initiating conversions on the AD7357 and framing the serial data transfer.", 11 AGND (power) "Analog Ground. This is the ground reference point for all analog circuitry on the AD7357. All analog input signals should be referred to this AGND voltage. The AGND and DGND voltages should ideally be at the same potential (See Datasheet)", 12 DGND (power) "Digital Ground. This is the ground reference point for all digital circuitry on the AD7357. This pin should connect to the DGND plane of a system. The DGND and AGND voltages should ideally be at the same potential and must (See Datasheet)", 13 SDATAB (hiz) "Serial Data Outputs. The data output is supplied to each pin as a serial data stream. The bits are clocked out on the falling edge of the SCLK input. 16 SCLK falling edges are required to access the 14 bits of data from the (See Datasheet)", 14 SDATAA (hiz) "Serial Data Outputs. The data output is supplied to each pin as a serial data stream. The bits are clocked out on the falling edge of the SCLK input. 16 SCLK falling edges are required to access the 14 bits of data from the (See Datasheet)", 15 SCLK (in) "Serial Clock. Logic input. A serial clock input provides the SCLK for accessing the data from the AD7357. This clock is also used as the clock source for the conversion process.", 16 VDRIVE (power) "Logic Power Supply Input. The voltage supplied at this pin determines at what voltage the interface operates. This pin should be decoupled to DGND. The voltage at this pin may be different to that at VDD."